# Altium footprint library ZabugorLib.PcbLib: 89 footprints (part 6 of 6)
Each footprint in its own frame and in the unit in brackets; x right, y up, seen from the top. Pads: shape width x height; smd on the part's side, far side on the other; paste and mask are expansions set on the pad; w line width, h text height; cw(c..) or ccw(c..) is an arc to the next point about the centre after c.
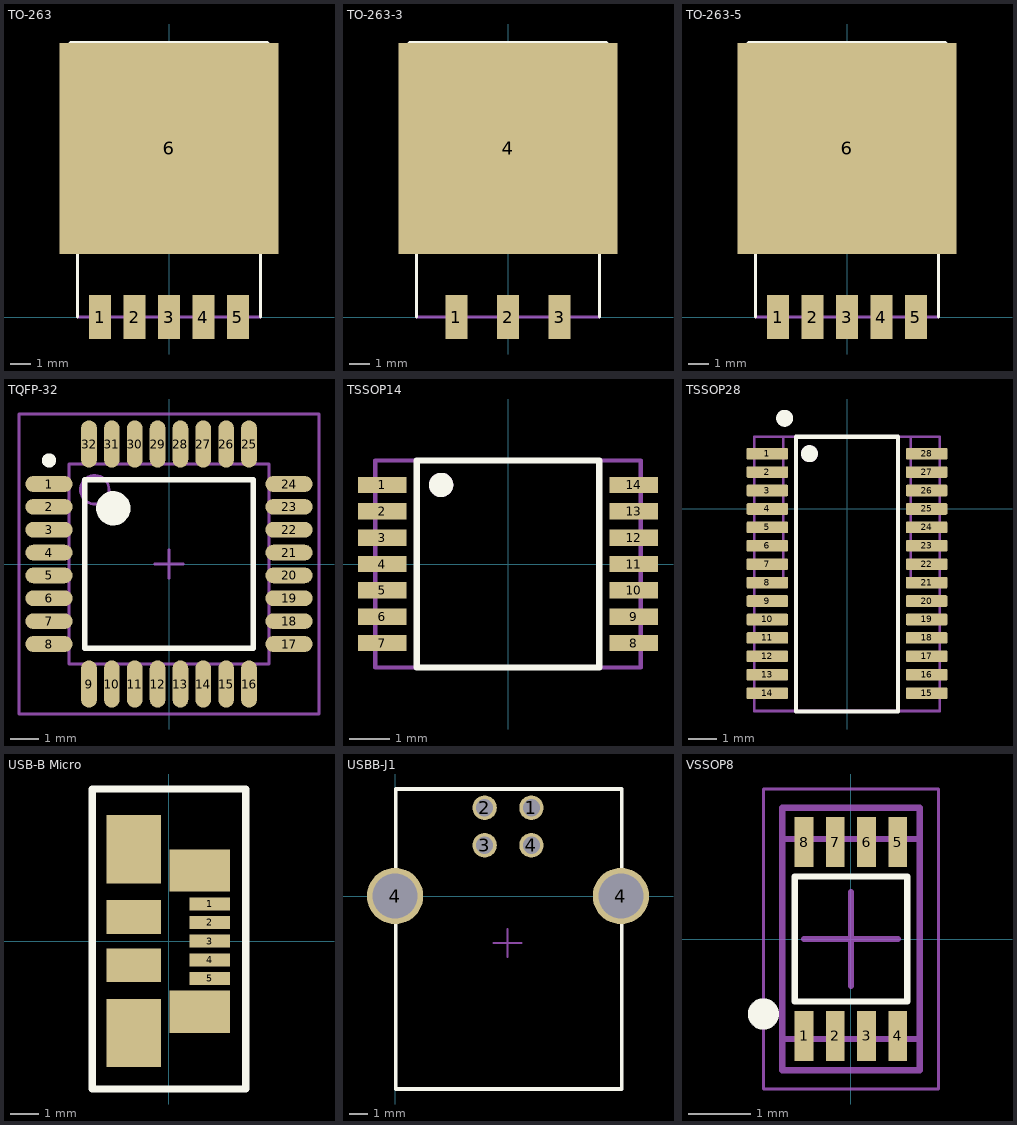
[diagram p5: the footprints below, top view; thin cyan lines are the x and y axes]

## TO-263 [mm]
pads (6):
  rect 1.07x2.16 smd: 1(-3.4,0) 2(-1.7,0) 3(0,0) 4(1.7,0) 5(3.4,0)
  rect 10.8x10.41 smd: 6(0,8.315)
Top Overlay:
  lines w0.15: -5.258,12.27 5.232,12.27 ; -4.51,0 -4.51,3.7 ; 4.51,0 4.51,3.7 ; -5.258,3.7 -5.258,13.142 -4.86,13.54 4.86,13.54 5.232,13.168 5.232,3.7 -5.258,3.7
Mechanical 7:
  lines w0.15: -5.25,12.27 -5.25,3.7 5.25,3.7 5.25,12.27 ; -4.51,3.7 -4.51,0 4.51,0 4.51,3.7 ; -5.1,12.27 5.232,12.27 3.962,13.54 -3.96,13.54 -5.1,12.4 -5.1,12.27
Mechanical 10:
  text ".Designator" at -1.3,-2.8 h0.7
  text ".Comment" at -1.3,17 h0.7
3D body "TS5B.STEP": height 4.58, standoff 0, extent -5.08,-0.9 5.1,13.45

## TO-263-3 [mm]
pads (4):
  rect 1.07x2.16 smd: 1(-2.54,0) 2(0,0) 3(2.54,0)
  rect 10.8x10.41 smd: 4(0,8.315)
Top Overlay:
  lines w0.15: -5.258,12.27 5.232,12.27 ; -4.51,0 -4.51,3.7 ; 4.51,0 4.51,3.7 ; -5.258,3.7 5.232,3.7 5.232,13.168 4.86,13.54 -4.86,13.54 -5.258,13.142 -5.258,3.7
Mechanical 7:
  lines w0.15: -5.25,12.27 -5.25,3.7 5.25,3.7 5.25,12.27 ; -4.51,3.7 -4.51,0 4.51,0 4.51,3.7 ; -5.1,12.27 -5.1,12.4 -3.96,13.54 3.962,13.54 5.232,12.27 -5.1,12.27
Mechanical 10:
  text ".Comment" at -1.3,17 h0.7
  text ".Designator" at -1.3,-2.8 h0.7
3D body "User Library-D?PAK TO-263-3.step": height 4.87, standoff 0, extent -5.07,-0.89 5.09,13.34

## TO-263-5 [mm]
pads (6):
  rect 1.07x2.16 smd: 1(-3.4,0) 2(-1.7,0) 3(0,0) 4(1.7,0) 5(3.4,0)
  rect 10.8x10.41 smd: 6(0,8.315)
Top Overlay:
  lines w0.15: -5.258,12.27 5.232,12.27 ; -4.51,0 -4.51,3.7 ; 4.51,0 4.51,3.7 ; -5.258,3.7 -5.258,13.142 -4.86,13.54 4.86,13.54 5.232,13.168 5.232,3.7 -5.258,3.7
Mechanical 7:
  lines w0.15: -5.25,12.27 -5.25,3.7 5.25,3.7 5.25,12.27 ; -4.51,3.7 -4.51,0 4.51,0 4.51,3.7 ; -5.1,12.27 5.232,12.27 3.962,13.54 -3.96,13.54 -5.1,12.4 -5.1,12.27
Mechanical 10:
  text ".Designator" at -1.3,-2.8 h0.7
  text ".Comment" at -1.3,17 h0.7
3D body: height 4.58, standoff 0, extent -5.08,-0.9 5.1,13.45

## TQFP-32 [mm] "Thin QFP, 32-Leads, Body 7x7mm, Pitch 0.8mm, IPC Medium Density"
height 1.2
pads (32):
  oval 1.65x0.55 smd: 1(-4.2,2.8) 2(-4.2,2) 3(-4.2,1.2) 4(-4.2,0.4) 5(-4.2,-0.4) 6(-4.2,-1.2) 7(-4.2,-2) 8(-4.2,-2.8) 17(4.2,-2.8) 18(4.2,-2) 19(4.2,-1.2) 20(4.2,-0.4) 21(4.2,0.4) 22(4.2,1.2) 23(4.2,2) 24(4.2,2.8)
  oval 0.55x1.65 smd: 9(-2.8,-4.2) 10(-2,-4.2) 11(-1.2,-4.2) 12(-0.4,-4.2) 13(0.4,-4.2) 14(1.2,-4.2) 15(2,-4.2) 16(2.8,-4.2) 25(2.8,4.2) 26(2,4.2) 27(1.2,4.2) 28(0.4,4.2) 29(-0.4,4.2) 30(-1.2,4.2) 31(-2,4.2) 32(-2.8,4.2)
Top Overlay:
  circle w0.25: c-4.2,3.625 r0.125
  circle w0.6: c-1.95,1.95 r0.3
  lines w0.2: -2.95,-2.95 -2.95,2.95 2.95,2.95 2.95,-2.95 -2.95,-2.95
Mechanical 13:
  circle w0.1: c-2.6,2.6 r0.5
  lines w0.1: -3.5,-3.5 -3.5,3.5 3.5,3.5 3.5,-3.5 -3.5,-3.5
Mechanical 15:
  lines w0.1: -0.5,0 0.5,0 ; 0,-0.5 0,0.5 ; -5.25,-5.25 -5.25,5.25 5.25,5.25 5.25,-5.25 -5.25,-5.25
3D body "User Library-tqfp32.step": height 1.2, standoff 0, extent -4.599,-4.6 4.599,4.599

## TSSOP14 [mm]
height 1.1
pads (14):
  rect 1.2x0.4 smd: 1(-3.1,1.95) 2(-3.1,1.3) 3(-3.1,0.65) 4(-3.1,0) 5(-3.1,-0.65) 6(-3.1,-1.3) 7(-3.1,-1.95) 8(3.1,-1.95) 9(3.1,-1.3) 10(3.1,-0.65) 11(3.1,0) 12(3.1,0.65) 13(3.1,1.3) 14(3.1,1.95)
Top Overlay:
  circle w0.3: c-1.65,1.95 r0.15
  lines w0.15: -2.25,-2.55 2.25,-2.55 2.25,2.55 -2.25,2.55 -2.25,-2.55
Mechanical 7:
  circle w0.3: c-1.65,1.95 r0.15
  lines w0.1: -2.25,-2.55 -2.25,2.55 ; 2.25,-2.55 2.25,2.55 ; -3.275,-2.55 -3.275,2.55 3.275,2.55 3.275,-2.55 -3.275,-2.55
Mechanical 10:
  text ".Designator" at -1.2,2.925 h0.8
  text ".Comment" at -1,-3.175 h0.6
3D body "User Library-TSSOP-14.STEP": height 1.2, standoff 0, extent -3.2,-2.5 3.2,2.5

## TSSOP28 [mm]
height 1.1
pads (28):
  rrect25% 1.47x0.41 smd: 1(-2.81,1.95) 2(-2.81,1.3) 3(-2.81,0.65) 4(-2.81,0) 5(-2.81,-0.65) 6(-2.81,-1.3) 7(-2.81,-1.95) 8(-2.81,-2.6) 9(-2.81,-3.25) 10(-2.81,-3.9) 11(-2.81,-4.55) 12(-2.81,-5.2) 13(-2.81,-5.85) 14(-2.81,-6.5) 15(2.81,-6.5) 16(2.81,-5.85) 17(2.81,-5.2) 18(2.81,-4.55) 19(2.81,-3.9) 20(2.81,-3.25) 21(2.81,-2.6) 22(2.81,-1.95) 23(2.81,-1.3) 24(2.81,-0.65) 25(2.81,0) 26(2.81,0.65) 27(2.81,1.3) 28(2.81,1.95)
Top Overlay:
  circle w0.3: c-1.325,1.95 r0.15
  circle w0.3: c-2.2,3.2 r0.15
  lines w0.15: -1.8,-7.15 1.8,-7.15 1.8,2.55 -1.8,2.55 -1.8,-7.15
Mechanical 7:
  circle w0.3: c-1.325,1.95 r0.15
  lines w0.1: -2.25,-2.55 -2.25,2.55 ; 2.25,-2.55 2.25,2.55 ; -3.275,-7.125 -3.275,2.55 3.275,2.55 3.275,-7.125 -3.275,-7.125
Mechanical 10:
  text ".Designator" at -1.2,2.925 h0.8
  text ".Comment" at -1,-3.175 h0.6
3D body "User Library-TSSOP-28.STEP": height 1.2, standoff 0, extent -3.2,-7.125 3.2,2.575

## USB-B Micro [mm]
pads (11):
  rect 1.4x0.45 smd: 1(1.425,1.3) 2(1.425,0.65) 3(1.425,0) 4(1.425,-0.65) 5(1.425,-1.3)
  rect 1.9x2.375 smd: ""(-1.225,-3.2) ""(-1.225,3.2)
  rect 1.9x1.175 smd: ""(-1.225,-0.837) ""(-1.225,0.837)
  rect 2.1x1.475 smd: ""(1.075,-2.462) ""(1.075,2.462)
Top Overlay:
  lines w0.254: -2.665,-5.15 -2.665,5.3 2.675,5.3 2.675,-5.15 -2.665,-5.15
3D body "micro-B USB.STEP": height 2.64, standoff -0.28, extent -3.925,-3.974 1.501,4

## USBB-J1 [mm]
pads (6):
  round 1.3 hole 0.92: 1(7.27,4.71) 2(4.77,4.71) 3(4.77,2.71) 4(7.27,2.71)
  round 3 hole 2.4: 4(0,0) 4(12.04,0)
Top Overlay:
  lines w0.2: 12.04,5.71 0.04,5.71 0.04,-10.29 12.08,-10.29 12.08,5.71
Mechanical 9:
  text ".Comment" at 5.25,-3.25 h0.8
  text ".Designator" at 5.25,-2.25 h1
Mechanical 11:
  lines w0.1: 12.04,5.71 0.04,5.71 0.04,-10.29 12.08,-10.29 12.08,5.71
Mechanical 15:
  lines w0.05: 12,5.71 0,5.71 0,-10.29 12.04,-10.29 12.04,5.71
  lines w0.1: 5.25,-2.5 6.75,-2.5 ; 6,-3.25 6,-1.75
3D body "User Library-Samtec - USB-B-S-X-W-TH.STEP": height 11, standoff -3.64, extent -1.398,-10.3 13.4,6.2

## VSSOP8 [mm]
height 1.75
pads (8):
  rect 0.3x0.8 smd mask+0.1: 1(-0.75,-1.55)
  rect 0.3x0.8 smd: 2(-0.25,-1.55) 3(0.25,-1.55) 4(0.75,-1.55) 5(0.75,1.55) 6(0.25,1.55) 7(-0.25,1.55) 8(-0.75,1.55)
Top Overlay:
  circle w0.25: c-1.4,-1.2 r0.125
  lines w0.1: -0.9,-1 0.9,-1 0.9,1 -0.9,1 -0.9,-1
Mechanical 9:
  text ".Designator" at -0.25,-0.75 h1
  text ".Comment" at 0.5,-0.75 h0.8
Mechanical 11:
  lines w0.1: -1.1,-1.6 1.1,-1.6 ; -1.1,1.6 1.1,1.6 ; -1.1,-2.1 1.1,-2.1 1.1,2.1 -1.1,2.1 -1.1,-2.1
Mechanical 15:
  lines w0.05: -1.4,-2.4 1.4,-2.4 1.4,2.4 -1.4,2.4 -1.4,-2.4
  lines w0.1: -0.75,0 0.75,0 ; 0,-0.75 0,0.75
3D body "User Library-SOP50P310X90-8N[8US8_VSSOP_DCU_MO-187CA].step": height 0.9, standoff 0, extent -1.05,-1.6 1.05,1.6